# Altium footprint library PcbLib_ICs.PcbLib: 317 footprints (part 9 of 24) (continued)
## LFCSP-40EP(HMC1121) [mm]
height 1
pads (41):
  rect 1x0.25 smd mask+0.05: 1(-3.075,2.25)
  rrect70% 1x0.25 smd mask+0.05: 2(-3.075,1.75) 3(-3.075,1.25) 4(-3.075,0.75) 5(-3.075,0.25) 6(-3.075,-0.25) 7(-3.075,-0.75) 8(-3.075,-1.25) 9(-3.075,-1.75) 10(-3.075,-2.25) 21(3.1,-2.25) 22(3.1,-1.75) 23(3.1,-1.25) 24(3.1,-0.75) 25(3.1,-0.25) 26(3.1,0.25) 27(3.1,0.75) 28(3.1,1.25) 29(3.1,1.75) 30(3.1,2.25)
  rrect70% 0.25x1 smd mask+0.05: 11(-2.25,-3.1) 12(-1.75,-3.1) 13(-1.25,-3.1) 14(-0.75,-3.1) 15(-0.25,-3.1) 16(0.25,-3.1) 17(0.75,-3.1) 18(1.25,-3.1) 19(1.75,-3.1) 20(2.25,-3.1) 31(2.25,3.1) 32(1.75,3.1) 33(1.25,3.1) 34(0.75,3.1) 35(0.25,3.1) 36(-0.25,3.1) 37(-0.75,3.1) 38(-1.25,3.1) 39(-1.75,3.1) 40(-2.25,3.1)
  rrect10% 4.7x4.7 smd paste-5 mask+0.05: EP(0,0)
Top Overlay:
  circle w0.25: c-3.9,2.8 r0.125
  lines w0.2: -3.4,-3.075 -3.4,-3.4 -3.075,-3.4 ; -3.4,3.175 -3.4,3.4 -3.075,3.4 ; 3.075,-3.4 3.4,-3.4 3.4,-3.075 ; 3.075,3.4 3.4,3.4 3.4,3.075
Top Paste:
  region: 1.5,2 1.5,1.5 2,1.5 2,2
  region: 0.8,2 0.8,1.5 1.3,1.5 1.3,2
  region: 0.1,2 0.1,1.5 0.6,1.5 0.6,2
  region: -0.6,2 -0.6,1.5 -0.1,1.5 -0.1,2
  region: -1.3,2 -1.3,1.5 -0.8,1.5 -0.8,2
  region: 1.5,1.3 1.5,0.8 2,0.8 2,1.3
  region: 0.8,1.3 0.8,0.8 1.3,0.8 1.3,1.3
  region: 0.1,1.3 0.1,0.8 0.6,0.8 0.6,1.3
  region: -0.6,1.3 -0.6,0.8 -0.1,0.8 -0.1,1.3
  region: -1.3,1.3 -1.3,0.8 -0.8,0.8 -0.8,1.3
  region: -2,2 -2,1.5 -1.5,1.5 -1.5,2
  region: -2,1.3 -2,0.8 -1.5,0.8 -1.5,1.3
  region: 2,-2 2,-1.5 1.5,-1.5 1.5,-2
  region: 1.3,-2 1.3,-1.5 0.8,-1.5 0.8,-2
  region: 0.6,-2 0.6,-1.5 0.1,-1.5 0.1,-2
  region: -0.1,-2 -0.1,-1.5 -0.6,-1.5 -0.6,-2
  region: -0.8,-2 -0.8,-1.5 -1.3,-1.5 -1.3,-2
  region: -1.5,-2 -1.5,-1.5 -2,-1.5 -2,-2
  region: 2,-1.3 2,-0.8 1.5,-0.8 1.5,-1.3
  region: 1.3,-1.3 1.3,-0.8 0.8,-0.8 0.8,-1.3
  region: 0.6,-1.3 0.6,-0.8 0.1,-0.8 0.1,-1.3
  region: -0.1,-1.3 -0.1,-0.8 -0.6,-0.8 -0.6,-1.3
  region: -0.8,-1.3 -0.8,-0.8 -1.3,-0.8 -1.3,-1.3
  region: -1.5,-1.3 -1.5,-0.8 -2,-0.8 -2,-1.3
  rectangle: -2,-0.6 -1.5,-0.1
  rectangle: -1.3,-0.6 -0.8,-0.1
  rectangle: -2,0.1 -1.5,0.6
  rectangle: -1.3,0.1 -0.8,0.6
  region: 2,0.6 1.5,0.6 1.5,0.1 2,0.1
  region: 1.3,0.6 0.8,0.6 0.8,0.1 1.3,0.1
  region: 2,-0.1 1.5,-0.1 1.5,-0.6 2,-0.6
  region: 1.3,-0.1 0.8,-0.1 0.8,-0.6 1.3,-0.6
  rectangle: -0.6,0.1 -0.1,0.6
  region: 0.6,0.6 0.1,0.6 0.1,0.1 0.6,0.1
  rectangle: -0.6,-0.6 -0.1,-0.1
  region: 0.6,-0.1 0.1,-0.1 0.1,-0.6 0.6,-0.6
Top Assy:
  circle w0.05: c-2.5,2.5 r0.25
  lines w0.05: -3,-2.375 -3.025,-2.375 -3.025,-2.125 -3,-2.125 ; -3,-1.875 -3.025,-1.875 -3.025,-1.625 -3,-1.625 ; -3,-1.375 -3.025,-1.375 -3.025,-1.125 -3,-1.125 ; -3,-0.875 -3.025,-0.875 -3.025,-0.625 -3,-0.625 ; -3,-0.375 -3.025,-0.375 -3.025,-0.125 -3,-0.125 ; -3,0.125 -3.025,0.125 -3.025,0.375 -3,0.375 ; -3,0.625 -3.025,0.625 -3.025,0.875 -3,0.875 ; -3,1.125 -3.025,1.125 -3.025,1.375 -3,1.375 ; -3,1.625 -3.025,1.625 -3.025,1.875 -3,1.875 ; -3,2.125 -3.025,2.125 -3.025,2.375 -3,2.375 ; -2.375,-3 -2.375,-3.025 -2.125,-3.025 -2.125,-3 ; -2.375,3 -2.375,3.025 -2.125,3.025 -2.125,3 ; -1.875,-3 -1.875,-3.025 -1.625,-3.025 -1.625,-3 ; -1.875,3 -1.875,3.025 -1.625,3.025 -1.625,3 ; -1.375,-3 -1.375,-3.025 -1.125,-3.025 -1.125,-3 ; -1.375,3 -1.375,3.025 -1.125,3.025 -1.125,3 ; -0.875,-3 -0.875,-3.025 -0.625,-3.025 -0.625,-3 ; -0.875,3 -0.875,3.025 -0.625,3.025 -0.625,3 ; -0.375,-3 -0.375,-3.025 -0.125,-3.025 -0.125,-3 ; -0.375,3 -0.375,3.025 -0.125,3.025 -0.125,3 ; 0.125,-3 0.125,-3.025 0.375,-3.025 0.375,-3 ; 0.125,3 0.125,3.025 0.375,3.025 0.375,3 ; 0.625,-3 0.625,-3.025 0.875,-3.025 0.875,-3 ; 0.625,3 0.625,3.025 0.875,3.025 0.875,3 ; 1.125,-3 1.125,-3.025 1.375,-3.025 1.375,-3 ; 1.125,3 1.125,3.025 1.375,3.025 1.375,3 ; 1.625,-3 1.625,-3.025 1.875,-3.025 1.875,-3 ; 1.625,3 1.625,3.025 1.875,3.025 1.875,3 ; 2.125,-3 2.125,-3.025 2.375,-3.025 2.375,-3 ; 2.125,3 2.125,3.025 2.375,3.025 2.375,3 ; 3,-2.375 3.025,-2.375 3.025,-2.125 3,-2.125 ; 3,-1.875 3.025,-1.875 3.025,-1.625 3,-1.625 ; 3,-1.375 3.025,-1.375 3.025,-1.125 3,-1.125 ; 3,-0.875 3.025,-0.875 3.025,-0.625 3,-0.625 ; 3,-0.375 3.025,-0.375 3.025,-0.125 3,-0.125 ; 3,0.125 3.025,0.125 3.025,0.375 3,0.375 ; 3,0.625 3.025,0.625 3.025,0.875 3,0.875 ; 3,1.125 3.025,1.125 3.025,1.375 3,1.375 ; 3,1.625 3.025,1.625 3.025,1.875 3,1.875 ; 3,2.125 3.025,2.125 3.025,2.375 3,2.375 ; -3,-3 3,-3 3,3 -3,3 -3,-3
  text ".Designator" at -2.579,-0.349 h1.5
Top Text:
  lines w0.05: -3.275,-3.275 3.275,-3.275 3.275,3.275 -3.275,3.275 -3.275,-3.275
  lines w0.1: -0.5,0 0.5,0 ; 0,-0.5 0,0.5
3D body "LFCSP-40.STEP": height 0.9, standoff 0, extent -3.025,-3.025 3.025,3.025

## LFCSP-48_FUSED_LEADS [mm] "AD CP-48-16 case style"
height 0.55
pads (49):
  rect 0.8x0.25 smd paste+0 mask+0.075: 1(-3.4,2.75)
  oval 0.8x0.25 smd paste+0 mask+0.075: 2(-3.4,2.25) 3(-3.4,1.75) 4(-3.4,1.25) 5(-3.4,0.75) 6(-3.4,0.25) 7(-3.4,-0.25) 8(-3.4,-0.75) 9(-3.4,-1.25) 10(-3.4,-1.75) 11(-3.4,-2.25) 12(-3.4,-2.75) 25(3.4,-2.75) 26(3.4,-2.25) 27(3.4,-1.75) 28(3.4,-1.25) 29(3.4,-0.75) 30(3.4,-0.25) 31(3.4,0.25) 32(3.4,0.75) 33(3.4,1.25) 34(3.4,1.75) 35(3.4,2.25) 36(3.4,2.75)
  oval 0.25x0.8 smd paste+0 mask+0.075: 13(-2.75,-3.4) 14(-2.25,-3.4) 15(-1.75,-3.4) 16(-1.25,-3.4) 17(-0.75,-3.4) 18(-0.25,-3.4) 19(0.25,-3.4) 20(0.75,-3.4) 21(1.25,-3.4) 22(1.75,-3.4) 23(2.25,-3.4) 24(2.75,-3.4) 37(2.75,3.4) 38(2.25,3.4) 39(1.75,3.4) 40(1.25,3.4) 41(0.75,3.4) 42(0.25,3.4) 43(-0.25,3.4) 44(-0.75,3.4) 45(-1.25,3.4) 46(-1.75,3.4) 47(-2.25,3.4) 48(-2.75,3.4)
  rrect10% 5.6x5.6 smd paste-50 mask+0.075: EP(0,0)
via -2,-1 diameter 0.7 hole 0.3
via -1,-2 diameter 0.7 hole 0.3
via 1,-2 diameter 0.7 hole 0.3
via 2,-1 diameter 0.7 hole 0.3
via 2,1 diameter 0.7 hole 0.3
via 1,2 diameter 0.7 hole 0.3
via -2,1 diameter 0.7 hole 0.3
via -1,2 diameter 0.7 hole 0.3
via 2,-2 diameter 0.7 hole 0.3
via 0.75,-0.75 diameter 0.7 hole 0.3
via -2,-2 diameter 0.7 hole 0.3
via -0.75,-0.75 diameter 0.7 hole 0.3
via -2,2 diameter 0.7 hole 0.3
via 0.75,0.75 diameter 0.7 hole 0.3
via 2,2 diameter 0.7 hole 0.3
via 0,0 diameter 0.7 hole 0.3
via -0.75,0.75 diameter 0.7 hole 0.3
Top Overlay:
  circle w0.25: c-4.3,3.5 r0.125
  lines w0.2: -3.65,-3.275 -3.65,-3.65 -3.275,-3.65 ; -3.65,3.275 -3.65,3.65 -3.275,3.65 ; 3.275,-3.65 3.65,-3.65 3.65,-3.275 ; 3.275,3.65 3.65,3.65 3.65,3.275
Top Paste:
  region: -2.2,-2.7 -2.2,-2.2 -2.7,-2.2 -2.7,-2.7
  region: -1.5,-2.7 -1.5,-2.2 -2,-2.2 -2,-2.7
  region: -0.8,-2.7 -0.8,-2.2 -1.3,-2.2 -1.3,-2.7
  region: 2.7,-2.7 2.7,-2.2 2.2,-2.2 2.2,-2.7
  region: 1.3,-2.7 1.3,-2.2 0.8,-2.2 0.8,-2.7
  region: 2,-2.7 2,-2.2 1.5,-2.2 1.5,-2.7
  region: -0.1,-2.7 -0.1,-2.2 -0.6,-2.2 -0.6,-2.7
  region: 0.6,-2.7 0.6,-2.2 0.1,-2.2 0.1,-2.7
  region: -2.2,-2 -2.2,-1.5 -2.7,-1.5 -2.7,-2
  region: -1.5,-2 -1.5,-1.5 -2,-1.5 -2,-2
  region: -0.8,-2 -0.8,-1.5 -1.3,-1.5 -1.3,-2
  region: 2.7,-2 2.7,-1.5 2.2,-1.5 2.2,-2
  region: 1.3,-2 1.3,-1.5 0.8,-1.5 0.8,-2
  region: 2,-2 2,-1.5 1.5,-1.5 1.5,-2
  region: -0.1,-2 -0.1,-1.5 -0.6,-1.5 -0.6,-2
  region: 0.6,-2 0.6,-1.5 0.1,-1.5 0.1,-2
  region: -2.2,-1.3 -2.2,-0.8 -2.7,-0.8 -2.7,-1.3
  region: -1.5,-1.3 -1.5,-0.8 -2,-0.8 -2,-1.3
  region: -0.8,-1.3 -0.8,-0.8 -1.3,-0.8 -1.3,-1.3
  region: 2.7,-1.3 2.7,-0.8 2.2,-0.8 2.2,-1.3
  region: 1.3,-1.3 1.3,-0.8 0.8,-0.8 0.8,-1.3
  region: 2,-1.3 2,-0.8 1.5,-0.8 1.5,-1.3
  region: -0.1,-1.3 -0.1,-0.8 -0.6,-0.8 -0.6,-1.3
  region: 0.6,-1.3 0.6,-0.8 0.1,-0.8 0.1,-1.3
  region: 2.2,2.7 2.2,2.2 2.7,2.2 2.7,2.7
  region: 1.5,2.7 1.5,2.2 2,2.2 2,2.7
  region: 0.8,2.7 0.8,2.2 1.3,2.2 1.3,2.7
  region: -2.7,2.7 -2.7,2.2 -2.2,2.2 -2.2,2.7
  region: -1.3,2.7 -1.3,2.2 -0.8,2.2 -0.8,2.7
  region: -2,2.7 -2,2.2 -1.5,2.2 -1.5,2.7
  region: 0.1,2.7 0.1,2.2 0.6,2.2 0.6,2.7
  region: -0.6,2.7 -0.6,2.2 -0.1,2.2 -0.1,2.7
  region: 2.2,2 2.2,1.5 2.7,1.5 2.7,2
  region: 1.5,2 1.5,1.5 2,1.5 2,2
  region: 0.8,2 0.8,1.5 1.3,1.5 1.3,2
  region: -2.7,2 -2.7,1.5 -2.2,1.5 -2.2,2
  region: -1.3,2 -1.3,1.5 -0.8,1.5 -0.8,2
  region: -2,2 -2,1.5 -1.5,1.5 -1.5,2
  region: 0.1,2 0.1,1.5 0.6,1.5 0.6,2
  region: -0.6,2 -0.6,1.5 -0.1,1.5 -0.1,2
  region: 2.2,1.3 2.2,0.8 2.7,0.8 2.7,1.3
  region: 1.5,1.3 1.5,0.8 2,0.8 2,1.3
  region: 0.8,1.3 0.8,0.8 1.3,0.8 1.3,1.3
  region: -2.7,1.3 -2.7,0.8 -2.2,0.8 -2.2,1.3
  region: -1.3,1.3 -1.3,0.8 -0.8,0.8 -0.8,1.3
  region: -2,1.3 -2,0.8 -1.5,0.8 -1.5,1.3
  region: 0.1,1.3 0.1,0.8 0.6,0.8 0.6,1.3
  region: -0.6,1.3 -0.6,0.8 -0.1,0.8 -0.1,1.3
  region: 2.7,-0.6 2.7,-0.1 2.2,-0.1 2.2,-0.6
  region: 2.2,0.6 2.2,0.1 2.7,0.1 2.7,0.6
  region: 2,-0.6 2,-0.1 1.5,-0.1 1.5,-0.6
  region: 1.5,0.6 1.5,0.1 2,0.1 2,0.6
  region: 1.3,-0.6 1.3,-0.1 0.8,-0.1 0.8,-0.6
  region: 0.8,0.6 0.8,0.1 1.3,0.1 1.3,0.6
  region: -2.7,0.6 -2.7,0.1 -2.2,0.1 -2.2,0.6
  region: -2.2,-0.6 -2.2,-0.1 -2.7,-0.1 -2.7,-0.6
  region: -1.3,0.6 -1.3,0.1 -0.8,0.1 -0.8,0.6
  region: -2,0.6 -2,0.1 -1.5,0.1 -1.5,0.6
  region: -1.5,-0.6 -1.5,-0.1 -2,-0.1 -2,-0.6
  region: -0.8,-0.6 -0.8,-0.1 -1.3,-0.1 -1.3,-0.6
  region: 0.1,0.6 0.1,0.1 0.6,0.1 0.6,0.6
  region: -0.6,0.6 -0.6,0.1 -0.1,0.1 -0.1,0.6
  region: -0.1,-0.6 -0.1,-0.1 -0.6,-0.1 -0.6,-0.6
  region: 0.6,-0.6 0.6,-0.1 0.1,-0.1 0.1,-0.6
Bottom Solder:
  region: -3,3 -0.75,3 0,2.25 0.75,3 3,3 3,0.75 2.25,0 3,-0.75 3,-3 0.75,-3 0,-2.25 -0.75,-3 -3,-3 -3,-0.75 -2.25,0 -3,0.75
Top Assy:
  circle w0.05: c-3,3 r0.25
  lines w0.05: -3.517,-2.85 -3.54,-2.85 -3.54,-2.65 -3.517,-2.65 ; -3.517,-2.35 -3.54,-2.35 -3.54,-2.15 -3.517,-2.15 ; -3.517,-1.85 -3.54,-1.85 -3.54,-1.65 -3.517,-1.65 ; -3.517,-1.35 -3.54,-1.35 -3.54,-1.15 -3.517,-1.15 ; -3.517,-0.85 -3.54,-0.85 -3.54,-0.65 -3.517,-0.65 ; -3.517,-0.35 -3.54,-0.35 -3.54,-0.15 -3.517,-0.15 ; -3.517,0.15 -3.54,0.15 -3.54,0.35 -3.517,0.35 ; -3.517,0.65 -3.54,0.65 -3.54,0.85 -3.517,0.85 ; -3.517,1.15 -3.54,1.15 -3.54,1.35 -3.517,1.35 ; -3.517,1.65 -3.54,1.65 -3.54,1.85 -3.517,1.85 ; -3.517,2.15 -3.54,2.15 -3.54,2.35 -3.517,2.35 ; -3.517,2.65 -3.54,2.65 -3.54,2.85 -3.517,2.85 ; -2.85,-3.517 -2.85,-3.54 -2.65,-3.54 -2.65,-3.517 ; -2.85,3.517 -2.85,3.54 -2.65,3.54 -2.65,3.517 ; -2.35,-3.517 -2.35,-3.54 -2.15,-3.54 -2.15,-3.517 ; -2.35,3.517 -2.35,3.54 -2.15,3.54 -2.15,3.517 ; -1.85,-3.517 -1.85,-3.54 -1.65,-3.54 -1.65,-3.517 ; -1.85,3.517 -1.85,3.54 -1.65,3.54 -1.65,3.517 ; -1.35,-3.517 -1.35,-3.54 -1.15,-3.54 -1.15,-3.517 ; -1.35,3.517 -1.35,3.54 -1.15,3.54 -1.15,3.517 ; -0.85,-3.517 -0.85,-3.54 -0.65,-3.54 -0.65,-3.517 ; -0.85,3.517 -0.85,3.54 -0.65,3.54 -0.65,3.517 ; -0.35,-3.517 -0.35,-3.54 -0.15,-3.54 -0.15,-3.517 ; -0.35,3.517 -0.35,3.54 -0.15,3.54 -0.15,3.517 ; 0.15,-3.517 0.15,-3.54 0.35,-3.54 0.35,-3.517 ; 0.15,3.517 0.15,3.54 0.35,3.54 0.35,3.517 ; 0.65,-3.517 0.65,-3.54 0.85,-3.54 0.85,-3.517 ; 0.65,3.517 0.65,3.54 0.85,3.54 0.85,3.517 ; 1.15,-3.517 1.15,-3.54 1.35,-3.54 1.35,-3.517 ; 1.15,3.517 1.15,3.54 1.35,3.54 1.35,3.517 ; 1.65,-3.517 1.65,-3.54 1.85,-3.54 1.85,-3.517 ; 1.65,3.517 1.65,3.54 1.85,3.54 1.85,3.517 ; 2.15,-3.517 2.15,-3.54 2.35,-3.54 2.35,-3.517 ; 2.15,3.517 2.15,3.54 2.35,3.54 2.35,3.517 ; 2.65,-3.517 2.65,-3.54 2.85,-3.54 2.85,-3.517 ; 2.65,3.517 2.65,3.54 2.85,3.54 2.85,3.517 ; 3.517,-2.85 3.54,-2.85 3.54,-2.65 3.517,-2.65 ; 3.517,-2.35 3.54,-2.35 3.54,-2.15 3.517,-2.15 ; 3.517,-1.85 3.54,-1.85 3.54,-1.65 3.517,-1.65 ; 3.517,-1.35 3.54,-1.35 3.54,-1.15 3.517,-1.15 ; 3.517,-0.85 3.54,-0.85 3.54,-0.65 3.517,-0.65 ; 3.517,-0.35 3.54,-0.35 3.54,-0.15 3.517,-0.15 ; 3.517,0.15 3.54,0.15 3.54,0.35 3.517,0.35 ; 3.517,0.65 3.54,0.65 3.54,0.85 3.517,0.85 ; 3.517,1.15 3.54,1.15 3.54,1.35 3.517,1.35 ; 3.517,1.65 3.54,1.65 3.54,1.85 3.517,1.85 ; 3.517,2.15 3.54,2.15 3.54,2.35 3.517,2.35 ; 3.517,2.65 3.54,2.65 3.54,2.85 3.517,2.85 ; -3.5,-3.5 3.5,-3.5 3.5,3.5 -3.5,3.5 -3.5,-3.5
  text ".Designator" at -3.443,-0.467 h2
Top Text:
  lines w0.05: -4.05,-4.05 4.05,-4.05 4.05,4.05 -4.05,4.05 -4.05,-4.05
  lines w0.1: -0.5,0 0.5,0 ; 0,-0.5 0,0.5
3D body "CP-48-16.STEP": height 0.75, standoff -0.04, extent -3.535,-3.535 3.535,3.535

## LFCSP-48EP [mm] "LFCSP-48EP package (7x7mm) with 0.5mm pitch"
height 0.9
pads (49):
  rect 0.75x0.25 smd paste+0 mask+0.08: 1(-3.375,2.75)
  oval 0.75x0.25 smd paste+0 mask+0.08: 2(-3.375,2.25) 3(-3.375,1.75) 4(-3.375,1.25) 5(-3.375,0.75) 6(-3.375,0.25) 7(-3.375,-0.25) 8(-3.375,-0.75) 9(-3.375,-1.25) 10(-3.375,-1.75) 11(-3.375,-2.25) 12(-3.375,-2.75) 25(3.375,-2.75) 26(3.375,-2.25) 27(3.375,-1.75) 28(3.375,-1.25) 29(3.375,-0.75) 30(3.375,-0.25) 31(3.375,0.25) 32(3.375,0.75) 33(3.375,1.25) 34(3.375,1.75) 35(3.375,2.25) 36(3.375,2.75)
  oval 0.25x0.75 smd paste+0 mask+0.08: 13(-2.75,-3.375) 14(-2.25,-3.375) 15(-1.75,-3.375) 16(-1.25,-3.375) 17(-0.75,-3.375) 18(-0.25,-3.375) 19(0.25,-3.375) 20(0.75,-3.375) 21(1.25,-3.375) 22(1.75,-3.375) 23(2.25,-3.375) 24(2.75,-3.375) 37(2.75,3.375) 38(2.25,3.375) 39(1.75,3.375) 40(1.25,3.375) 41(0.75,3.375) 42(0.25,3.375) 43(-0.25,3.375) 44(-0.75,3.375) 45(-1.25,3.375) 46(-1.75,3.375) 47(-2.25,3.375) 48(-2.75,3.375)
  rrect10% 5.6x5.6 smd paste-10 mask+0.08: EP(0,0)
via 0,0 diameter 0.7 hole 0.3
via 2,2 diameter 0.7 hole 0.3
via 1.75,1 diameter 0.7 hole 0.3
via 1,1.75 diameter 0.7 hole 0.3
via 0.75,0.75 diameter 0.7 hole 0.3
via -0.75,0.75 diameter 0.7 hole 0.3
via -1.75,1 diameter 0.7 hole 0.3
via -1,1.75 diameter 0.7 hole 0.3
via -2,2 diameter 0.7 hole 0.3
via -0.75,-0.75 diameter 0.7 hole 0.3
via -1,-1.75 diameter 0.7 hole 0.3
via -1.75,-1 diameter 0.7 hole 0.3
via -2,-2 diameter 0.7 hole 0.3
via 0.75,-0.75 diameter 0.7 hole 0.3
via 1.75,-1 diameter 0.7 hole 0.3
via 1,-1.75 diameter 0.7 hole 0.3
via 2,-2 diameter 0.7 hole 0.3
via -1.4,0 diameter 0.7 hole 0.3
via 0,1.4 diameter 0.7 hole 0.3
via 1.4,0 diameter 0.7 hole 0.3
via 0,-1.4 diameter 0.7 hole 0.3
Top Overlay:
  circle w0.25: c-4.35,3.55 r0.125
  lines w0.2: -3.7,-3.275 -3.275,-3.7 ; -3.7,3.275 -3.275,3.7 ; 3.275,-3.7 3.7,-3.275 ; 3.275,3.7 3.7,3.275
Top Paste:
  rectangle: 0.1,-0.7 0.7,-0.1
  rectangle: -0.7,-0.7 -0.1,-0.1
  rectangle: -1.5,-0.7 -0.9,-0.1
  rectangle: 0.9,-0.7 1.5,-0.1
  region: -0.1,0.7 -0.7,0.7 -0.7,0.1 -0.1,0.1
  region: 0.7,0.7 0.1,0.7 0.1,0.1 0.7,0.1
  region: 1.5,0.7 0.9,0.7 0.9,0.1 1.5,0.1
  region: -0.9,0.7 -1.5,0.7 -1.5,0.1 -0.9,0.1
  region: -0.1,1.5 -0.7,1.5 -0.7,0.9 -0.1,0.9
  region: 0.7,1.5 0.1,1.5 0.1,0.9 0.7,0.9
  region: 1.5,1.5 0.9,1.5 0.9,0.9 1.5,0.9
  region: -0.9,1.5 -1.5,1.5 -1.5,0.9 -0.9,0.9
  region: -0.1,2.3 -0.7,2.3 -0.7,1.7 -0.1,1.7
  region: 0.7,2.3 0.1,2.3 0.1,1.7 0.7,1.7
  region: 1.5,2.3 0.9,2.3 0.9,1.7 1.5,1.7
  region: -0.9,2.3 -1.5,2.3 -1.5,1.7 -0.9,1.7
  rectangle: 0.1,-1.5 0.7,-0.9
  rectangle: -0.7,-1.5 -0.1,-0.9
  rectangle: -1.5,-1.5 -0.9,-0.9
  rectangle: 0.9,-1.5 1.5,-0.9
  rectangle: 0.1,-2.3 0.7,-1.7
  rectangle: -0.7,-2.3 -0.1,-1.7
  rectangle: -1.5,-2.3 -0.9,-1.7
  rectangle: 0.9,-2.3 1.5,-1.7
  rectangle: 1.7,-0.7 2.3,-0.1
  region: 2.3,0.7 1.7,0.7 1.7,0.1 2.3,0.1
  region: 2.3,1.5 1.7,1.5 1.7,0.9 2.3,0.9
  region: 2.3,2.3 1.7,2.3 1.7,1.7 2.3,1.7
  rectangle: 1.7,-1.5 2.3,-0.9
  rectangle: 1.7,-2.3 2.3,-1.7
  region: -1.7,0.7 -2.3,0.7 -2.3,0.1 -1.7,0.1
  rectangle: -2.3,-0.7 -1.7,-0.1
  rectangle: -2.3,-1.5 -1.7,-0.9
  rectangle: -2.3,-2.3 -1.7,-1.7
  region: -1.7,1.5 -2.3,1.5 -2.3,0.9 -1.7,0.9
  region: -1.7,2.3 -2.3,2.3 -2.3,1.7 -1.7,1.7
Bottom Solder:
  region: -3,3 -0.75,3 0,2.25 0.75,3 3,3 3,0.75 2.25,0 3,-0.75 3,-3 0.75,-3 0,-2.25 -0.75,-3 -3,-3 -3,-0.75 -2.25,0 -3,0.75
Top Assy:
  drawing of 1177 lines, arcs and shapes, not listed
  text ".Designator" at -3.443,-0.467 h2
Top Text:
  lines w0.05: -3.85,-3.85 -3.85,3.85 3.85,3.85 3.85,-3.85 -3.85,-3.85
  lines w0.1: -0.5,0 0.5,0 ; 0,-0.5 0,0.5
3D body "User Library-LFCSP 48-pin.step": height 0.86, standoff 0.01, extent -3.5,-3.5 3.5,3.5

## LFCSP-64EP [mm] "LFCSP-64EP with 0.5mm pitch"
height 1
pads (65):
  rect 0.85x0.25 smd paste+0 mask+0.08: 1(-4.425,3.75)
  oval 0.85x0.25 smd paste+0 mask+0.08: 2(-4.425,3.25) 3(-4.425,2.75) 4(-4.425,2.25) 5(-4.425,1.75) 6(-4.425,1.25) 7(-4.425,0.75) 8(-4.425,0.25) 9(-4.425,-0.25) 10(-4.425,-0.75) 11(-4.425,-1.25) 12(-4.425,-1.75) 13(-4.425,-2.25) 14(-4.425,-2.75) 15(-4.425,-3.25) 16(-4.425,-3.75) 33(4.425,-3.75) 34(4.425,-3.25) 35(4.425,-2.75) 36(4.425,-2.25) 37(4.425,-1.75) 38(4.425,-1.25) 39(4.425,-0.75) 40(4.425,-0.25) 41(4.425,0.25) 42(4.425,0.75) 43(4.425,1.25) 44(4.425,1.75) 45(4.425,2.25) 46(4.425,2.75) 47(4.425,3.25) 48(4.425,3.75)
  oval 0.25x0.85 smd paste+0 mask+0.08: 17(-3.775,-4.425) 18(-3.275,-4.425) 19(-2.775,-4.425) 20(-2.275,-4.425) 21(-1.775,-4.425) 22(-1.275,-4.425) 23(-0.775,-4.425) 24(-0.275,-4.425) 25(0.225,-4.425) 26(0.725,-4.425) 27(1.225,-4.425) 28(1.725,-4.425) 29(2.225,-4.425) 30(2.725,-4.425) 31(3.225,-4.425) 32(3.725,-4.425) 49(3.75,4.425) 50(3.25,4.425) 51(2.75,4.425) 52(2.25,4.425) 53(1.75,4.425) 54(1.25,4.425) 55(0.75,4.425) 56(0.25,4.425) 57(-0.25,4.425) 58(-0.75,4.425) 59(-1.25,4.425) 60(-1.75,4.425) 61(-2.25,4.425) 62(-2.75,4.425) 63(-3.25,4.425) 64(-3.75,4.425)
  rrect10% 5.21x5.21 smd paste-10 mask+0.08: EP(0,0)
via 0,0 diameter 0.7 hole 0.3
via 2,2 diameter 0.7 hole 0.3
via 1.75,1 diameter 0.7 hole 0.3
via 1,1.75 diameter 0.7 hole 0.3
via 0.75,0.75 diameter 0.7 hole 0.3
via -0.75,0.75 diameter 0.7 hole 0.3
via -1.75,1 diameter 0.7 hole 0.3
via -1,1.75 diameter 0.7 hole 0.3
via -2,2 diameter 0.7 hole 0.3
via -0.75,-0.75 diameter 0.7 hole 0.3
via -1,-1.75 diameter 0.7 hole 0.3
via -1.75,-1 diameter 0.7 hole 0.3
via -2,-2 diameter 0.7 hole 0.3
via 0.75,-0.75 diameter 0.7 hole 0.3
via 1.75,-1 diameter 0.7 hole 0.3
via 1,-1.75 diameter 0.7 hole 0.3
via 2,-2 diameter 0.7 hole 0.3
via -1.4,0 diameter 0.7 hole 0.3
via 0,1.4 diameter 0.7 hole 0.3
via 1.4,0 diameter 0.7 hole 0.3
via 0,-1.4 diameter 0.7 hole 0.3
Top Overlay:
  circle w0.25: c-5.35,4.55 r0.125
  lines w0.2: -4.7,-4.275 -4.275,-4.7 ; -4.7,4.275 -4.275,4.7 ; 4.275,-4.7 4.7,-4.275 ; 4.275,4.7 4.7,4.275
Top Paste:
  region: -1.7,2.3 -2.3,2.3 -2.3,1.7 -1.7,1.7
  region: -1.7,1.5 -2.3,1.5 -2.3,0.9 -1.7,0.9
  rectangle: -2.3,-2.3 -1.7,-1.7
  rectangle: -2.3,-1.5 -1.7,-0.9
  rectangle: -2.3,-0.7 -1.7,-0.1
  region: -1.7,0.7 -2.3,0.7 -2.3,0.1 -1.7,0.1
  rectangle: 1.7,-2.3 2.3,-1.7
  rectangle: 1.7,-1.5 2.3,-0.9
  region: 2.3,2.3 1.7,2.3 1.7,1.7 2.3,1.7
  region: 2.3,1.5 1.7,1.5 1.7,0.9 2.3,0.9
  region: 2.3,0.7 1.7,0.7 1.7,0.1 2.3,0.1
  rectangle: 1.7,-0.7 2.3,-0.1
  rectangle: 0.9,-2.3 1.5,-1.7
  rectangle: -1.5,-2.3 -0.9,-1.7
  rectangle: -0.7,-2.3 -0.1,-1.7
  rectangle: 0.1,-2.3 0.7,-1.7
  rectangle: 0.9,-1.5 1.5,-0.9
  rectangle: -1.5,-1.5 -0.9,-0.9
  rectangle: -0.7,-1.5 -0.1,-0.9
  rectangle: 0.1,-1.5 0.7,-0.9
  region: -0.9,2.3 -1.5,2.3 -1.5,1.7 -0.9,1.7
  region: 1.5,2.3 0.9,2.3 0.9,1.7 1.5,1.7
  region: 0.7,2.3 0.1,2.3 0.1,1.7 0.7,1.7
  region: -0.1,2.3 -0.7,2.3 -0.7,1.7 -0.1,1.7
  region: -0.9,1.5 -1.5,1.5 -1.5,0.9 -0.9,0.9
  region: 1.5,1.5 0.9,1.5 0.9,0.9 1.5,0.9
  region: 0.7,1.5 0.1,1.5 0.1,0.9 0.7,0.9
  region: -0.1,1.5 -0.7,1.5 -0.7,0.9 -0.1,0.9
  region: -0.9,0.7 -1.5,0.7 -1.5,0.1 -0.9,0.1
  region: 1.5,0.7 0.9,0.7 0.9,0.1 1.5,0.1
  region: 0.7,0.7 0.1,0.7 0.1,0.1 0.7,0.1
  region: -0.1,0.7 -0.7,0.7 -0.7,0.1 -0.1,0.1
  rectangle: 0.9,-0.7 1.5,-0.1
  rectangle: -1.5,-0.7 -0.9,-0.1
  rectangle: -0.7,-0.7 -0.1,-0.1
  rectangle: 0.1,-0.7 0.7,-0.1
Bottom Solder:
  region: -3,3 -0.75,3 0,2.25 0.75,3 3,3 3,0.75 2.25,0 3,-0.75 3,-3 0.75,-3 0,-2.25 -0.75,-3 -3,-3 -3,-0.75 -2.25,0 -3,0.75
Top Assy:
  drawing of 801 lines, arcs and shapes, not listed
  text ".Designator" at -3.443,-0.467 h2
Top Text:
  lines w0.05: -4.85,-4.85 -4.85,4.85 4.85,4.85 4.85,-4.85 -4.85,-4.85
  lines w0.1: -0.5,0 0.5,0 ; 0,-0.5 0,0.5
3D body "User Library-LFCSP-64 AD9984AKCPZ-170.step": height 0.85, standoff -0.02, extent -4.5,-4.5 4.5,4.5

## LFCSP-72EP [mm] "LFCSP-72 package with 0.5mm pitch"
height 1
pads (73):
  rect 0.8x0.25 smd paste+0 mask+0.08: 1(-4.925,4.25)
  oval 0.8x0.25 smd paste+0 mask+0.08: 2(-4.925,3.75) 3(-4.925,3.25) 4(-4.925,2.75) 5(-4.925,2.25) 6(-4.925,1.75) 7(-4.925,1.25) 8(-4.925,0.75) 9(-4.925,0.25) 10(-4.925,-0.25) 11(-4.925,-0.75) 12(-4.925,-1.25) 13(-4.925,-1.75) 14(-4.925,-2.25) 15(-4.925,-2.75) 16(-4.925,-3.25) 17(-4.925,-3.75) 18(-4.925,-4.25) 37(4.925,-4.25) 38(4.925,-3.75) 39(4.925,-3.25) 40(4.925,-2.75) 41(4.925,-2.25) 42(4.925,-1.75) 43(4.925,-1.25) 44(4.925,-0.75) 45(4.925,-0.25) 46(4.925,0.25) 47(4.925,0.75) 48(4.925,1.25) 49(4.925,1.75) 50(4.925,2.25) 51(4.925,2.75) 52(4.925,3.25) 53(4.925,3.75) 54(4.925,4.25)
  oval 0.25x0.8 smd paste+0 mask+0.08: 19(-4.25,-4.925) 20(-3.75,-4.925) 21(-3.25,-4.925) 22(-2.75,-4.925) 23(-2.25,-4.925) 24(-1.75,-4.925) 25(-1.25,-4.925) 26(-0.75,-4.925) 27(-0.25,-4.925) 28(0.25,-4.925) 29(0.75,-4.925) 30(1.25,-4.925) 31(1.75,-4.925) 32(2.25,-4.925) 33(2.75,-4.925) 34(3.25,-4.925) 35(3.75,-4.925) 36(4.25,-4.925) 55(4.25,4.925) 56(3.75,4.925) 57(3.25,4.925) 58(2.75,4.925) 59(2.25,4.925) 60(1.75,4.925) 61(1.25,4.925) 62(0.75,4.925) 63(0.25,4.925) 64(-0.25,4.925) 65(-0.75,4.925) 66(-1.25,4.925) 67(-1.75,4.925) 68(-2.25,4.925) 69(-2.75,4.925) 70(-3.25,4.925) 71(-3.75,4.925) 72(-4.25,4.925)
  rrect10% 6x6 smd paste-10 mask+0.08: EP(0,0)
via -1.5,0.75 diameter 0.7 hole 0.3
via -1.5,-0.75 diameter 0.7 hole 0.3
via -2.25,0.75 diameter 0.7 hole 0.3
via -0.75,2.25 diameter 0.7 hole 0.3
via -2.25,2.25 diameter 0.7 hole 0.3
via -2.25,-0.75 diameter 0.7 hole 0.3
via -0.75,-2.25 diameter 0.7 hole 0.3
via -2.25,-2.25 diameter 0.7 hole 0.3
via -1.5,-1.5 diameter 0.7 hole 0.3
via -0.75,-0.75 diameter 0.7 hole 0.3
via 0.75,-2.25 diameter 0.7 hole 0.3
via 2.25,-0.75 diameter 0.7 hole 0.3
via 2.25,-2.25 diameter 0.7 hole 0.3
via 1.5,-1.5 diameter 0.7 hole 0.3
via 0.75,-0.75 diameter 0.7 hole 0.3
via 2.25,0.75 diameter 0.7 hole 0.3
via 0.75,2.25 diameter 0.7 hole 0.3
via 2.25,2.25 diameter 0.7 hole 0.3
via 1.5,1.5 diameter 0.7 hole 0.3
via 0.75,0.75 diameter 0.7 hole 0.3
via 0,0 diameter 0.7 hole 0.3
via -0.75,-1.5 diameter 0.7 hole 0.3
via 0.75,-1.5 diameter 0.7 hole 0.3
via 1.5,-0.75 diameter 0.7 hole 0.3
via 1.5,0.75 diameter 0.7 hole 0.3
via 0.75,1.5 diameter 0.7 hole 0.3
via -0.75,1.5 diameter 0.7 hole 0.3
via 0,1.5 diameter 0.7 hole 0.3
via -1.5,0 diameter 0.7 hole 0.3
via 0,-1.5 diameter 0.7 hole 0.3
via 1.5,0 diameter 0.7 hole 0.3
via -0.75,0.75 diameter 0.7 hole 0.3
via -1.5,1.5 diameter 0.7 hole 0.3
Top Overlay:
  circle w0.25: c-5.825,5.025 r0.125
  lines w0.2: -5.175,-4.775 -4.775,-5.175 ; -5.175,4.775 -4.775,5.175 ; 4.775,-5.175 5.175,-4.775 ; 4.775,5.175 5.175,4.775
Top Paste:
  region: -1.7,2.3 -2.3,2.3 -2.3,1.7 -1.7,1.7
  region: -1.7,1.5 -2.3,1.5 -2.3,0.9 -1.7,0.9
  rectangle: -2.3,-2.3 -1.7,-1.7
  rectangle: -2.3,-1.5 -1.7,-0.9
  rectangle: -2.3,-0.7 -1.7,-0.1
  region: -1.7,0.7 -2.3,0.7 -2.3,0.1 -1.7,0.1
  rectangle: 1.7,-2.3 2.3,-1.7
  rectangle: 1.7,-1.5 2.3,-0.9
  region: 2.3,2.3 1.7,2.3 1.7,1.7 2.3,1.7
  region: 2.3,1.5 1.7,1.5 1.7,0.9 2.3,0.9
  region: 2.3,0.7 1.7,0.7 1.7,0.1 2.3,0.1
  rectangle: 1.7,-0.7 2.3,-0.1
  rectangle: 0.9,-2.3 1.5,-1.7
  rectangle: -1.5,-2.3 -0.9,-1.7
  rectangle: -0.7,-2.3 -0.1,-1.7
  rectangle: 0.1,-2.3 0.7,-1.7
  rectangle: 0.9,-1.5 1.5,-0.9
  rectangle: -1.5,-1.5 -0.9,-0.9
  rectangle: -0.7,-1.5 -0.1,-0.9
  rectangle: 0.1,-1.5 0.7,-0.9
  region: -0.9,2.3 -1.5,2.3 -1.5,1.7 -0.9,1.7
  region: 1.5,2.3 0.9,2.3 0.9,1.7 1.5,1.7
  region: 0.7,2.3 0.1,2.3 0.1,1.7 0.7,1.7
  region: -0.1,2.3 -0.7,2.3 -0.7,1.7 -0.1,1.7
  region: -0.9,1.5 -1.5,1.5 -1.5,0.9 -0.9,0.9
  region: 1.5,1.5 0.9,1.5 0.9,0.9 1.5,0.9
  region: 0.7,1.5 0.1,1.5 0.1,0.9 0.7,0.9
  region: -0.1,1.5 -0.7,1.5 -0.7,0.9 -0.1,0.9
  region: -0.9,0.7 -1.5,0.7 -1.5,0.1 -0.9,0.1
  region: 1.5,0.7 0.9,0.7 0.9,0.1 1.5,0.1
  region: 0.7,0.7 0.1,0.7 0.1,0.1 0.7,0.1
  region: -0.1,0.7 -0.7,0.7 -0.7,0.1 -0.1,0.1
  rectangle: 0.9,-0.7 1.5,-0.1
  rectangle: -1.5,-0.7 -0.9,-0.1
  rectangle: -0.7,-0.7 -0.1,-0.1
  rectangle: 0.1,-0.7 0.7,-0.1
  rectangle: 2.5,-2.3 3.1,-1.7
  rectangle: 2.5,-1.5 3.1,-0.9
  region: 3.1,2.3 2.5,2.3 2.5,1.7 3.1,1.7
  region: 3.1,1.5 2.5,1.5 2.5,0.9 3.1,0.9
  region: 3.1,0.7 2.5,0.7 2.5,0.1 3.1,0.1
  rectangle: 2.5,-0.7 3.1,-0.1
  region: -2.5,2.3 -3.1,2.3 -3.1,1.7 -2.5,1.7
  region: -2.5,1.5 -3.1,1.5 -3.1,0.9 -2.5,0.9
  rectangle: -3.1,-2.3 -2.5,-1.7
  rectangle: -3.1,-1.5 -2.5,-0.9
  rectangle: -3.1,-0.7 -2.5,-0.1
  region: -2.5,0.7 -3.1,0.7 -3.1,0.1 -2.5,0.1
  region: -1.7,3.1 -2.3,3.1 -2.3,2.5 -1.7,2.5
  region: 2.3,3.1 1.7,3.1 1.7,2.5 2.3,2.5
  region: -0.9,3.1 -1.5,3.1 -1.5,2.5 -0.9,2.5
  region: 1.5,3.1 0.9,3.1 0.9,2.5 1.5,2.5
  region: 0.7,3.1 0.1,3.1 0.1,2.5 0.7,2.5
  region: -0.1,3.1 -0.7,3.1 -0.7,2.5 -0.1,2.5
  region: 3.1,3.1 2.5,3.1 2.5,2.5 3.1,2.5
  region: -2.5,3.1 -3.1,3.1 -3.1,2.5 -2.5,2.5
  rectangle: 1.7,-3.1 2.3,-2.5
  rectangle: -2.3,-3.1 -1.7,-2.5
  rectangle: 0.9,-3.1 1.5,-2.5
  rectangle: -1.5,-3.1 -0.9,-2.5
  rectangle: -0.7,-3.1 -0.1,-2.5
  rectangle: 0.1,-3.1 0.7,-2.5
  rectangle: -3.1,-3.1 -2.5,-2.5
  rectangle: 2.5,-3.1 3.1,-2.5
Bottom Solder:
  region: -3.25,3.25 -0.5,3.25 0,2.75 0.5,3.25 3.25,3.25 3.25,0.5 2.75,0 3.25,-0.5 3.25,-3.25 0.5,-3.25 0,-2.75 -0.5,-3.25 -3.25,-3.25 -3.25,-0.5 -2.75,0 -3.25,0.5
Top Assy:
  drawing of 249 lines, arcs and shapes, not listed
  text ".Designator" at -3.443,-0.467 h2
Top Text:
  lines w0.05: -5.325,-5.325 -5.325,5.325 5.325,5.325 5.325,-5.325 -5.325,-5.325
  lines w0.1: -0.5,0 0.5,0 ; 0,-0.5 0,0.5
3D body "User Library-LFCSP-72.STEP": height 1, standoff 0, extent -5.02,-5.02 5.02,5.02